# Altium footprint library Summer_Studio.PcbLib: 44 footprints (part 2 of 3)
Each footprint in its own frame and in the unit in brackets; x right, y up, seen from the top. Pads: shape width x height; smd on the part's side, far side on the other; paste and mask are expansions set on the pad; w line width, h text height; cw(c..) or ccw(c..) is an arc to the next point about the centre after c.
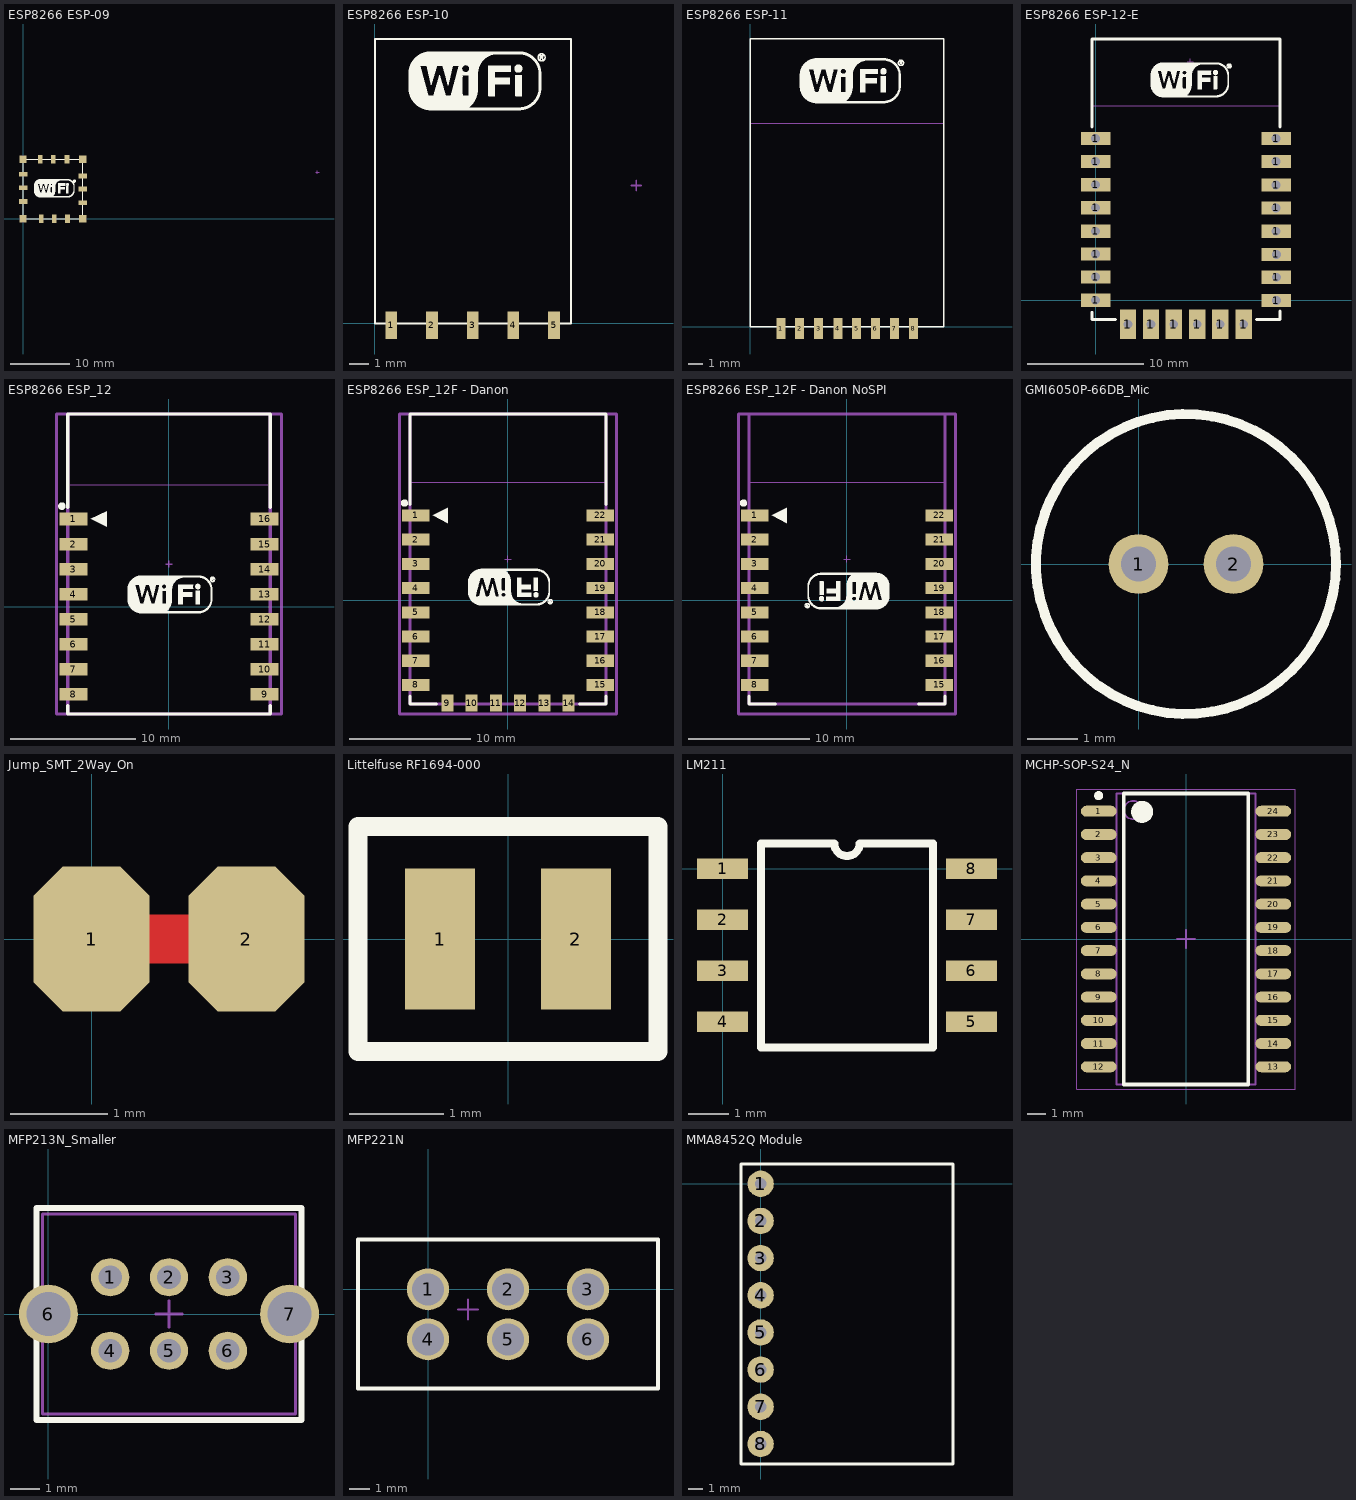
[diagram p1: the footprints below, top view; thin cyan lines are the x and y axes]

## ESP8266 ESP-09 [mm] "ESP8266 ESP-09"
pads (16):
  rect 1.2x1.2 smd: 1(0,0) 5(10,0) 9(10,10) 13(0,10)
  rect 0.8x1.4 smd: 2(3.023,0) 3(5.232,0) 4(7.442,0) 10(7.366,10) 11(5.055,10) 12(2.87,10)
  rect 1.4x0.8 smd: 6(10,2.692) 7(10,4.978) 8(10,7.188) 14(0,7.493) 15(0,5.194) 16(0,2.896)
Top Overlay:
  drawing of 1264 lines, arcs and shapes, not listed
  text ".Designator" at -0.635,-1.651 h1
Mechanical 15:
  lines w0.1: 49.2,7.796 49.708,7.796 ; 49.454,7.542 49.454,8.05
3D body: height 0.5, standoff 0, extent 0,0 10.008,10.008
3D body: height 1, standoff 0.5, extent 2.565,2.769 7.061,7.087

## ESP8266 ESP-10 [mm] "ESP8266 ESP-10"
pads (5):
  rect 0.6x1.4 smd: 1(0.838,-0.102) 2(2.915,-0.102) 3(4.991,-0.102) 4(7.068,-0.102) 5(9.144,-0.102)
Top Overlay:
  drawing of 1264 lines, arcs and shapes, not listed
  text ".Designator" at 0,-1.803 h1
Mechanical 15:
  lines w0.1: 13.081,7.034 13.589,7.034 ; 13.335,6.78 13.335,7.288
3D body: height 0.5, standoff 0, extent 0,0 10.008,14.478
3D body: height 1, standoff 0.5, extent 0.889,5.41 5.385,9.728
3D body: height 1, standoff 0.5, extent 0.914,1.676 3.175,4.14

## ESP8266 ESP-11 [mm] "ESP8266 ESP-11"
pads (8):
  rect 0.6x1.4 smd: 1(2.057,-0.127) 2(3.327,-0.127) 3(4.597,-0.127) 4(5.893,-0.127) 5(7.137,-0.127) 6(8.407,-0.127) 7(9.677,-0.127) 8(10.947,-0.127)
Top Overlay:
  drawing of 1264 lines, arcs and shapes, not listed
  text ".Designator" at 0,-1.93 h1
Mechanical 13:
  lines w0.051: 0.026,13.639 13,13.64
  text "CUTOUT POLYGON" at 0.28,18.278 h0.25
  text "ANTENNA AREA" at 0.28,18.786 h0.25
Mechanical 15:
  lines w0.1: 6.35,17.346 6.858,17.346 ; 6.604,17.092 6.604,17.6
3D body: height 0.5, standoff 0, extent 0,0 13.005,19.304
3D body: height 1, standoff 0.5, extent 2.718,7.671 7.214,11.989
3D body: height 1, standoff 0.5, extent 2.743,3.937 5.004,6.401

## ESP8266 ESP-12-E [mil] "ESP8266 ESP-12-E"
pads (22):
  rect 100x45 hole 30: 1(0,0) 1(0,79) 1(0,157) 1(0,235) 1(0,315) 1(0,393) 1(0,472) 1(0,550) 1(614,235) 1(614,314) 1(614,392) 1(614,472) 1(614,550) 1(615,-1) 1(615,78) 1(615,156)
  rect 55x100 hole 30: 1(110,-82) 1(188,-82) 1(266,-82) 1(346,-82) 1(424,-82) 1(504,-82)
Top Overlay:
  drawing of 1267 lines, arcs and shapes, not listed
  text ".Designator" at -26,-180 h39.37
Mechanical 13:
  lines w2: -9.96,661.97 630.04,661.97
  text "CUTOUT POLYGON" at 0.04,844.59 h10
  text "ANTENNA AREA" at 0.04,864.59 h10
Mechanical 15:
  lines w3.94: 312,811.92 332,811.92 ; 322,801.92 322,821.92
3D body "User Library-ESP_12_E.STEP": height 85.7, standoff -1.17, extent -8,-59.44 621.92,885.44

## ESP8266 ESP_12 [mm] "ESP8266 ESP-12"
height 3.2
pads (16):
  rect 2.25x1 smd: 1(-7.625,7) 2(-7.625,5) 3(-7.625,3) 4(-7.625,1) 5(-7.625,-1) 6(-7.625,-3) 7(-7.625,-5) 8(-7.625,-7) 9(7.625,-7) 10(7.625,-5) 11(7.625,-3) 12(7.625,-1) 13(7.625,1) 14(7.625,3) 15(7.625,5) 16(7.625,7)
Top Overlay:
  drawing of 1268 lines, arcs and shapes, not listed
  text ".Designator" at -8.433,-9.398 h1
Mechanical 13:
  lines w0.051: -8.127,9.727 8.129,9.727 8.129,15.382 -8.127,15.382 -8.127,9.727
  lines w0.254: -8.084,-8.568 -8.084,15.371 8.084,15.371 8.084,-8.568 -8.084,-8.568
  text "ANTENNA AREA" at -7.873,14.874 h0.25
  text "CUTOUT POLYGON" at -7.873,14.366 h0.25
Mechanical 15:
  lines w0.1: -0.254,3.402 0.254,3.402 ; 0,3.148 0,3.656
  lines w0.254: -8.975,-8.568 8.975,-8.568 8.975,15.371 -8.975,15.371 -8.975,-8.568
3D body "ESP_12_ENew.STEP": height 3.82, standoff -0.05, extent -7.859,-8.522 8.156,15.509

## ESP8266 ESP_12F - Danon [mm] "ESP8266 ESP-12"
height 3.2
pads (22):
  rect 2.25x1 smd: 1(-7.625,7) 2(-7.625,5) 3(-7.625,3) 4(-7.625,1) 5(-7.625,-1) 6(-7.625,-3) 7(-7.625,-5) 8(-7.625,-7) 15(7.625,-7) 16(7.625,-5) 17(7.625,-3) 18(7.625,-1) 19(7.625,1) 20(7.625,3) 21(7.625,5) 22(7.625,7)
  rect 1x1.4 smd: 9(-5,-8.5) 10(-3,-8.5) 11(-1,-8.5) 12(1,-8.5) 13(3,-8.5) 14(5,-8.5)
Top Overlay:
  drawing of 1269 lines, arcs and shapes, not listed
  text ".Designator" at -8.4,-10.2 h1
Mechanical 13:
  lines w0.051: -8.127,9.727 8.129,9.727 8.129,15.382 -8.127,15.382 -8.127,9.727
  lines w0.254: -8.084,-8.568 -8.084,15.371 8.084,15.371 8.084,-8.568 -8.084,-8.568
  text "ANTENNA AREA" at -7.873,14.874 h0.25
  text "CUTOUT POLYGON" at -7.873,14.366 h0.25
Mechanical 15:
  lines w0.1: -0.254,3.402 0.254,3.402 ; 0,3.148 0,3.656
  lines w0.254: -8.975,-9.398 8.975,-9.398 8.975,15.371 -8.975,15.371 -8.975,-9.398
3D body "ESP_12_ENew.STEP": height 3.82, standoff -0.05, extent -8.007,-8.568 8.007,15.462

## ESP8266 ESP_12F - Danon NoSPI [mm] "ESP8266 ESP-12"
height 3.2
pads (16):
  rect 2.25x1 smd: 1(-7.625,7) 2(-7.625,5) 3(-7.625,3) 4(-7.625,1) 5(-7.625,-1) 6(-7.625,-3) 7(-7.625,-5) 8(-7.625,-7) 15(7.625,-7) 16(7.625,-5) 17(7.625,-3) 18(7.625,-1) 19(7.625,1) 20(7.625,3) 21(7.625,5) 22(7.625,7)
Top Overlay:
  drawing of 1266 lines, arcs and shapes, not listed
  text ".Designator" at -8.4,-10.2 h1
Mechanical 13:
  lines w0.051: -8.127,9.727 -8.127,15.382 8.129,15.382 8.129,9.727 -8.127,9.727
  lines w0.254: -8.084,-8.568 8.084,-8.568 8.084,15.371 -8.084,15.371 -8.084,-8.568
  text "CUTOUT POLYGON" at -7.873,14.366 h0.25
  text "ANTENNA AREA" at -7.873,14.874 h0.25
Mechanical 15:
  lines w0.1: -0.254,3.402 0.254,3.402 ; 0,3.148 0,3.656
  lines w0.254: -8.975,-9.398 -8.975,15.371 8.975,15.371 8.975,-9.398 -8.975,-9.398
3D body "ESP_12_ENew.STEP": height 3.82, standoff -0.05, extent -8.007,-8.568 8.007,15.462

## GMI6050P-66DB_Mic [mm]
pads (2):
  round 1.2 hole 0.7: 1(0,0) 2(1.9,0)
Top Overlay:
  circle w0.2: c0.95,0 r3
3D body: height 5, standoff -0.04, extent -2.1,-3 4,3.1

## Jump_SMT_2Way_On [mm]
pads (2):
  oct 1.2x1.5 smd: 1(0,0) 2(1.6,0)
Top Layer:
  lines w0.508: 0,0 1.6,0

## LCC6 [mm]

## Littelfuse RF1694-000 [mm]
pads (2):
  rect 0.75x1.5 smd: 1(-0.725,0) 2(0.725,0)
Top Overlay:
  lines w0.2: -1.6,-1.2 -1.6,0 -1.6,1.2 1.6,1.2 1.6,-1.2 -1.6,-1.2

## LM211 [mm]
pads (8):
  rect 1.27x0.51 smd: 1(0,0) 2(0,-1.27) 3(0,-2.54) 4(0,-3.81) 5(6.2,-3.81) 6(6.2,-2.54) 7(6.2,-1.27) 8(6.2,0)
Top Overlay:
  lines w0.2: 0.96,-4.445 0.96,0.635 2.782,0.635 ccw(c3.1,0.635) 3.417,0.635 5.24,0.635 5.24,-4.445 0.96,-4.445

## MCHP-SOP-S24_N [mm] "SOP, 24-Leads, Body 15.698x7.506mm, Pitch 0.5mm, IPC Medium Density"
height 2.65
pads (24):
  oval 1.95x0.6 smd: 1(-4.775,6.985) 2(-4.775,5.715) 3(-4.775,4.445) 4(-4.775,3.175) 5(-4.775,1.905) 6(-4.775,0.635) 7(-4.775,-0.635) 8(-4.775,-1.905) 9(-4.775,-3.175) 10(-4.775,-4.445) 11(-4.775,-5.715) 12(-4.775,-6.985) 13(4.775,-6.985) 14(4.775,-5.715) 15(4.775,-4.445) 16(4.775,-3.175) 17(4.775,-1.905) 18(4.775,-0.635) 19(4.775,0.635) 20(4.775,1.905) 21(4.775,3.175) 22(4.775,4.445) 23(4.775,5.715) 24(4.775,6.985)
Top Overlay:
  circle w0.25: c-4.775,7.835 r0.125
  circle w0.6: c-2.4,6.95 r0.3
  lines w0.2: -3.4,-7.95 -3.4,7.95 3.4,7.95 3.4,-7.95 -3.4,-7.95
Mechanical 13:
  circle w0.1: c-2.9,7.05 r0.5
  lines w0.1: -3.8,-7.95 -3.8,7.95 3.8,7.95 3.8,-7.95 -3.8,-7.95
Mechanical 15:
  lines w0.05: -5.975,-8.2 -5.975,8.2 5.975,8.2 5.975,-8.2 -5.975,-8.2
  lines w0.1: -0.5,0 0.5,0 ; 0,-0.5 0,0.5
3D body: height 2.65, standoff 0.1, extent -3.8,-7.95 3.8,7.95

## MFP213N_Smaller [mm]
height 8
pads (8):
  round 1.3 hole 0.8 paste+0: 1(2.1,1.25) 2(4.1,1.25) 3(6.1,1.25) 4(2.1,-1.25) 5(4.1,-1.25) 6(6.1,-1.25)
  round 2 hole 1.5 paste+0: 6(0,0) 7(8.2,0)
Top Overlay:
  lines w0.2: -0.4,-3.6 8.6,-3.6 8.6,3.6 -0.4,3.6 -0.4,-3.6
Mechanical 13:
  lines w0.1: -0.2,-3.4 -0.2,3.4 8.4,3.4 8.4,-3.4 -0.2,-3.4
Mechanical 15:
  lines w0.05: -0.2,-3.4 8.4,-3.4 8.4,3.4 -0.2,3.4 -0.2,-3.4
  lines w0.1: 3.65,0 4.55,0 ; 4.1,-0.45 4.1,0.45
3D body: height 4.7, standoff 0, extent -0.2,-3.4 8.4,3.4
3D body: height 8.7, standoff 4.7, extent 2.1,-1 4.1,1

## MFP221N [mm]
height 14
pads (6):
  round 2.1 hole 1.6 paste+0: 1(0,0) 2(4,0) 3(8,0) 4(0,-2.5) 5(4,-2.5) 6(8,-2.5)
Top Overlay:
  lines w0.2: -3.5,-4.975 -3.5,2.5 11.5,2.5 11.5,-4.975 -3.5,-4.975
Mechanical 13:
  lines w0.1: -3.5,-4.975 11.5,-4.975 11.5,2.5 -3.5,2.5 -3.5,-4.975
Mechanical 15:
  lines w0.05: -3.5,-4.975 -3.5,2.5 11.5,2.5 11.5,-4.975 -3.5,-4.975
  lines w0.1: 1.5,-1 2.5,-1 ; 2,-1.5 2,-0.5
3D body: height 14, standoff 7, extent -0.5,-3.15 4.5,0.65
3D body: height 7, standoff 0, extent -3.5,-5 11.5,2.5

## MMA8452Q Module [mm]
pads (8):
  round 1.8 hole 0.8: 1(0,0) 2(0,-2.54) 3(0,-5.08) 4(0,-7.62) 5(0,-10.16) 6(0,-12.7) 7(0,-15.24) 8(0,-17.78)
Top Overlay:
  lines w0.2: -1.35,-19.15 13.15,-19.15 13.15,1.35 -1.35,1.35 -1.35,-19.15
3D body: height 2.5, standoff 1.6, extent -1.35,-19.15 13.15,1.35
3D body: height 1.6, standoff 0, extent 7.493,-7.747 7.493,-7.747
3D body: height 1.6, standoff 0, extent -1.524,1.651 -1.524,1.651